# Altium footprint library Connectors.PcbLib: 245 footprints (part 5 of 18)
Each footprint in its own frame and in the unit in brackets; x right, y up, seen from the top. Pads: shape width x height; smd on the part's side, far side on the other; paste and mask are expansions set on the pad; w line width, h text height; cw(c..) or ccw(c..) is an arc to the next point about the centre after c.
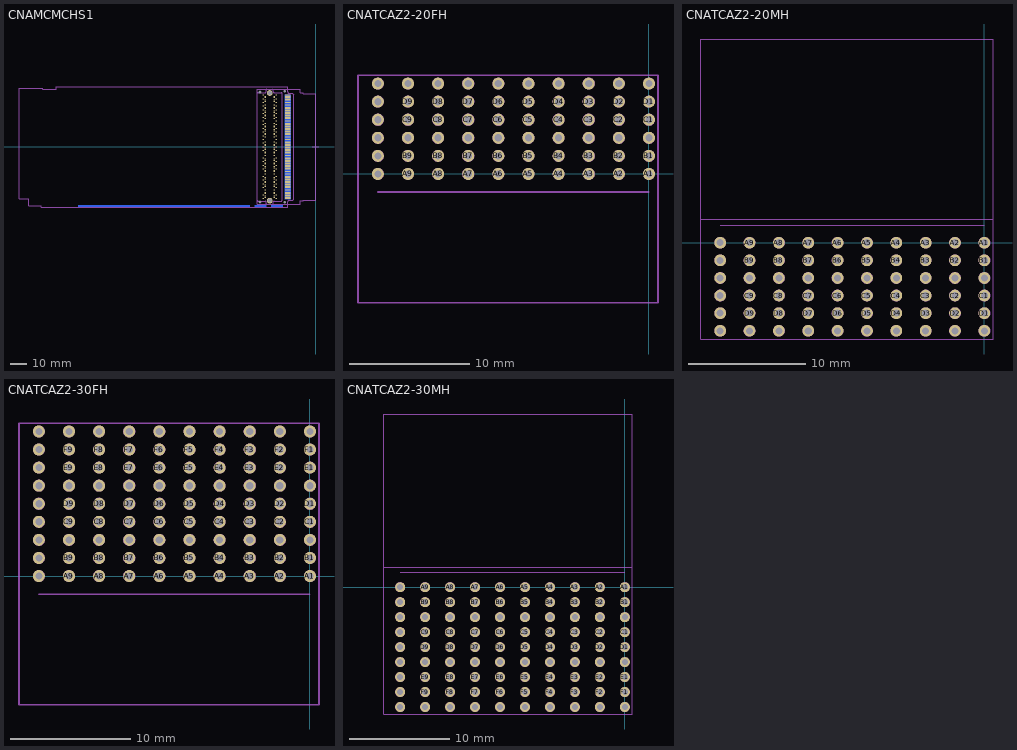
[diagram p4: the footprints below, top view; thin cyan lines are the x and y axes]

## CNAMCMCHS1 [mm] "AMC single for MCH connector standard"
pads (349):
  rrect50% 0.9x0.53 smd paste-2: A1(-31.95,31.5) A2(-30.75,30.75) A3(-30.75,30) A4(-31.95,29.25) A5(-30.75,28.5) A6(-30.75,27.75) A7(-31.95,27) A8(-30.75,26.25) A9(-30.75,25.5) A10(-31.95,24.75) A11(-30.75,24) A12(-30.75,23.25) A13(-31.95,22.5) A14(-30.75,21.75) A15(-30.75,21) A16(-31.95,20.25) A17(-30.75,19.5) A18(-30.75,18.75) A19(-31.95,18) A20(-30.75,17.25) A21(-30.75,16.5) A22(-31.95,15.75) A23(-30.75,15) A24(-30.75,14.25) A25(-31.95,13.5) A26(-30.75,12.75) A27(-30.75,12) A28(-31.95,11.25) A29(-30.75,10.5) A30(-30.75,9.75) A31(-31.95,9) A32(-30.75,8.25) A33(-30.75,7.5) A34(-31.95,6.75) A35(-30.75,6) A36(-30.75,5.25) A37(-31.95,4.5) A38(-30.75,3.75) A39(-30.75,3) A40(-31.95,2.25) A41(-30.75,1.5) A42(-30.75,0.75) A43(-31.95,0) A44(-30.75,-0.75) A45(-30.75,-1.5) A46(-31.95,-2.25) A47(-30.75,-3) A48(-30.75,-3.75) A49(-31.95,-4.5) A50(-30.75,-5.25) A51(-30.75,-6) A52(-31.95,-6.75) A53(-30.75,-7.5) A54(-30.75,-8.25) A55(-31.95,-9) A56(-30.75,-9.75) A57(-30.75,-10.5) A58(-31.95,-11.25) A59(-30.75,-12) A60(-30.75,-12.75) A61(-31.95,-13.5) A62(-30.75,-14.25) A63(-30.75,-15) A64(-31.95,-15.75) A65(-30.75,-16.5) A66(-30.75,-17.25) A67(-31.95,-18) A68(-30.75,-18.75) A69(-30.75,-19.5) A70(-31.95,-20.25) A71(-30.75,-21) A72(-30.75,-21.75) A73(-31.95,-22.5) A74(-30.75,-23.25) A75(-30.75,-24) A76(-31.95,-24.75) A77(-30.75,-25.5) A78(-30.75,-26.25) A79(-31.95,-27) A80(-30.75,-27.75) A81(-30.75,-28.5) A82(-31.95,-29.25) A83(-30.75,-30) A84(-30.75,-30.75) A85(-31.95,-31.5) A86(-24.05,-31.5) A87(-25.25,-30.75) A88(-25.25,-30) A89(-24.05,-29.25) A90(-25.25,-28.5) A91(-25.25,-27.75) A92(-24.05,-27) A93(-25.25,-26.25) A94(-25.25,-25.5) A95(-24.05,-24.75) A96(-25.25,-24) A97(-25.25,-23.25) A98(-24.05,-22.5) A99(-25.25,-21.75) A100(-25.25,-21) A101(-24.05,-20.25) A102(-25.25,-19.5) A103(-25.25,-18.75) A104(-24.05,-18) A105(-25.25,-17.25) A106(-25.25,-16.5) A107(-24.05,-15.75) A108(-25.25,-15) A109(-25.25,-14.25) A110(-24.05,-13.5) A111(-25.25,-12.75) A112(-25.25,-12) A113(-24.05,-11.25) A114(-25.25,-10.5) A115(-25.25,-9.75) A116(-24.05,-9) A117(-25.25,-8.25) A118(-25.25,-7.5) A119(-24.05,-6.75) A120(-25.25,-6) A121(-25.25,-5.25) A122(-24.05,-4.5) A123(-25.25,-3.75) A124(-25.25,-3) A125(-24.05,-2.25) A126(-25.25,-1.5) A127(-25.25,-0.75) A128(-24.05,0) A129(-25.25,0.75) A130(-25.25,1.5) A131(-24.05,2.25) A132(-25.25,3) A133(-25.25,3.75) A134(-24.05,4.5) A135(-25.25,5.25) A136(-25.25,6) A137(-24.05,6.75) A138(-25.25,7.5) A139(-25.25,8.25) A140(-24.05,9) A141(-25.25,9.75) A142(-25.25,10.5) A143(-24.05,11.25) A144(-25.25,12) A145(-25.25,12.75) A146(-24.05,13.5) A147(-25.25,14.25) A148(-25.25,15) A149(-24.05,15.75) A150(-25.25,16.5) A151(-25.25,17.25) A152(-24.05,18) A153(-25.25,18.75) A154(-25.25,19.5) A155(-24.05,20.25) A156(-25.25,21) A157(-25.25,21.75) A158(-24.05,22.5) A159(-25.25,23.25) A160(-25.25,24) A161(-24.05,24.75) A162(-25.25,25.5) A163(-25.25,26.25) A164(-24.05,27) A165(-25.25,27.75) A166(-25.25,28.5) A167(-24.05,29.25) A168(-25.25,30) A169(-25.25,30.75) A170(-24.05,31.5)
  rect 3.5x0.5 smd paste-2: B1(-17.05,31.5) B2(-17.05,30.75) B3(-17.05,30) B4(-17.05,29.25) B5(-17.05,28.5) B6(-17.05,27.75) B7(-17.05,27) B8(-17.05,26.25) B9(-17.05,25.5) B10(-17.05,24.75) B11(-17.05,24) B12(-17.05,23.25) B13(-17.05,22.5) B14(-17.05,21.75) B15(-17.05,21) B16(-17.05,20.25) B17(-17.05,19.5) B18(-17.05,18.75) B19(-17.05,18) B20(-17.05,17.25) B21(-17.05,16.5) B22(-17.05,15.75) B23(-17.05,15) B24(-17.05,14.25) B25(-17.05,13.5) B26(-17.05,12.75) B27(-17.05,12) B28(-17.05,11.25) B29(-17.05,10.5) B30(-17.05,9.75) B31(-17.05,9) B32(-17.05,8.25) B33(-17.05,7.5) B34(-17.05,6.75) B35(-17.05,6) B36(-17.05,5.25) B37(-17.05,4.5) B38(-17.05,3.75) B39(-17.05,3) B40(-17.05,2.25) B41(-17.05,1.5) B42(-17.05,0.75) B43(-17.05,0) B44(-17.05,-0.75) B45(-17.05,-1.5) B46(-17.05,-2.25) B47(-17.05,-3) B48(-17.05,-3.75) B49(-17.05,-4.5) B50(-17.05,-5.25) B51(-17.05,-6) B52(-17.05,-6.75) B53(-17.05,-7.5) B54(-17.05,-8.25) B55(-17.05,-9) B56(-17.05,-9.75) B57(-17.05,-10.5) B58(-17.05,-11.25) B59(-17.05,-12) B60(-17.05,-12.75) B61(-17.05,-13.5) B62(-17.05,-14.25) B63(-17.05,-15) B64(-17.05,-15.75) B65(-17.05,-16.5) B66(-17.05,-17.25) B67(-17.05,-18) B68(-17.05,-18.75) B69(-17.05,-19.5) B70(-17.05,-20.25) B71(-17.05,-21) B72(-17.05,-21.75) B73(-17.05,-22.5) B74(-17.05,-23.25) B75(-17.05,-24) B76(-17.05,-24.75) B77(-17.05,-25.5) B78(-17.05,-26.25) B79(-17.05,-27) B80(-17.05,-27.75) B81(-17.05,-28.5) B82(-17.05,-29.25) B83(-17.05,-30) B84(-17.05,-30.75) B85(-17.05,-31.5)
  rect 3.5x0.5 smd far side paste-2: B86(-17.05,-31.5) B87(-17.05,-30.75) B88(-17.05,-30) B89(-17.05,-29.25) B90(-17.05,-28.5) B91(-17.05,-27.75) B92(-17.05,-27) B93(-17.05,-26.25) B94(-17.05,-25.5) B95(-17.05,-24.75) B96(-17.05,-24) B97(-17.05,-23.25) B98(-17.05,-22.5) B99(-17.05,-21.75) B100(-17.05,-21) B101(-17.05,-20.25) B102(-17.05,-19.5) B103(-17.05,-18.75) B104(-17.05,-18) B105(-17.05,-17.25) B106(-17.05,-16.5) B107(-17.05,-15.75) B108(-17.05,-15) B109(-17.05,-14.25) B110(-17.05,-13.5) B111(-17.05,-12.75) B112(-17.05,-12) B113(-17.05,-11.25) B114(-17.05,-10.5) B115(-17.05,-9.75) B116(-17.05,-9) B117(-17.05,-8.25) B118(-17.05,-7.5) B119(-17.05,-6.75) B120(-17.05,-6) B121(-17.05,-5.25) B122(-17.05,-4.5) B123(-17.05,-3.75) B124(-17.05,-3) B125(-17.05,-2.25) B126(-17.05,-1.5) B127(-17.05,-0.75) B128(-17.05,0) B129(-17.05,0.75) B130(-17.05,1.5) B131(-17.05,2.25) B132(-17.05,3) B133(-17.05,3.75) B134(-17.05,4.5) B135(-17.05,5.25) B136(-17.05,6) B137(-17.05,6.75) B138(-17.05,7.5) B139(-17.05,8.25) B140(-17.05,9) B141(-17.05,9.75) B142(-17.05,10.5) B143(-17.05,11.25) B144(-17.05,12) B145(-17.05,12.75) B146(-17.05,13.5) B147(-17.05,14.25) B148(-17.05,15) B149(-17.05,15.75) B150(-17.05,16.5) B151(-17.05,17.25) B152(-17.05,18) B153(-17.05,18.75) B154(-17.05,19.5) B155(-17.05,20.25) B156(-17.05,21) B157(-17.05,21.75) B158(-17.05,22.5) B159(-17.05,23.25) B160(-17.05,24) B161(-17.05,24.75) B162(-17.05,25.5) B163(-17.05,26.25) B164(-17.05,27) B165(-17.05,27.75) B166(-17.05,28.5) B167(-17.05,29.25) B168(-17.05,30) B169(-17.05,30.75) B170(-17.05,31.5)
  rect 7x1 smd far side paste-3 mask-3: EP1(-23.5,-35.95) EP2(-33.5,-35.95)
  rect 104.45x1 smd far side paste-3 mask-3: EP3(-92.225,-35.95)
  rect 0x0 hole 1.9 unplated: MH1(-34,-33.5) MH2(-34,33.5)
  round 3.5 hole 2.5: MH3(-28,-32.75) MH4(-28,32.75)
  rect 0x0 hole 1.6 unplated: MH5(-18.8,-33.75) MH6(-18.8,33.75)
Top Solder:
  rectangle: -158,35.1 -16.866,36.9
  rectangle: -157.475,-36.9 -16.866,-35.1
  rectangle: -18.821,-32.766 -13.081,32.766
Bottom Solder:
  rectangle: -157.475,-36.9 -16.866,-35.1
  rectangle: -18.821,-32.766 -13.081,32.741
  rectangle: -158,35.1 -16.866,36.9
Mechanical 13:
  lines w0.102: 0,-32.43 0,32.43 -7.508,32.43 -7.508,32.88 -9.502,32.88 -9.502,35 -35.7,35 -35.7,-35 -9.5,-35 -9.5,-32.88 -7.506,-32.88 -7.506,-32.43 0.002,-32.43
Mechanical 14:
  lines w0.102: -35.5,-32.5 ccw(c-35,-32.5) -35,-33 -30.75,-33 cw(c-30.75,-33.5) -30.25,-33.5 -30.25,-34.5 ccw(c-29.75,-34.5) -29.75,-35 -26.25,-35 ccw(c-26.25,-34.5) -25.75,-34.5 -25.75,-33.5 cw(c-25.25,-33.5) -25.25,-33 -21,-33 ccw(c-21,-32.5) -20.5,-32.5 -20.5,32.5 ccw(c-21,32.5) -21,33 -25.25,33 cw(c-25.25,33.5) -25.75,33.5 -25.75,34.5 ccw(c-26.25,34.5) -26.25,35 -29.75,35 ccw(c-29.75,34.5) -30.25,34.5 -30.25,33.5 cw(c-30.75,33.5) -30.75,33 -35,33 ccw(c-35,32.5) -35.5,32.5 -35.5,-32.5
Mechanical 15:
  lines w0.1: -17,-36.75 -167,-36.75 -167,-35.75 -174.6,-35.75 -174.6,-31.55 -180.6,-31.55 -180.6,35.65 -166.25,35.65 -166.25,35.15 -158,35.15 -158,36.75 -17,36.75
  lines w0.102: -17,-36.75 -17,-33.516 ; -17,-33.525 cw(c-15.975,-33.525) -15.975,-32.5 -14.391,-32.5 ccw(c-14.391,-32) -14.038,-32.354 ; -17,36.75 -17,33.525 ccw(c-15.975,33.525) -15.975,32.5 -14.391,32.5 cw(c-14.391,32) -14.038,32.354 ; -14.032,-32.36 -13.442,-31.77 ; -14.032,32.36 -13.442,31.77 ; -13.446,-31.766 ccw(c-13.8,-31.412) -13.3,-31.412 -13.3,31.412 ccw(c-13.8,31.412) -13.446,31.766
  lines w0.15: -2,0 2,0
3D body: height 9.01, standoff -3.01, extent -12.959,-33.964 -10.449,-31.453
3D body: height 9.01, standoff -3.01, extent -12.959,31.453 -10.449,33.964
3D body: height 0.76, standoff 0.75, extent -7.495,-31.75 -0.777,-31.267
3D body: height 0.76, standoff 0.75, extent -7.495,-31 -0.766,-30.517
3D body: height 0.76, standoff 0.75, extent -7.495,-30.25 -1.223,-29.767
3D body: height 0.76, standoff 0.75, extent -7.495,-28 -1.539,-27.517
3D body: height 0.76, standoff 0.75, extent -7.495,-28.75 -1.539,-28.267
3D body: height 0.76, standoff 0.75, extent -7.495,-29.5 -0.777,-29.017
3D body: height 0.76, standoff 0.75, extent -7.495,-25.75 -1.539,-25.267
3D body: height 0.76, standoff 0.75, extent -7.495,-26.5 -1.539,-26.017
3D body: height 0.76, standoff 0.75, extent -7.495,-27.25 -0.777,-26.767
3D body: height 0.76, standoff 0.75, extent -7.495,-23.5 -1.539,-23.017
3D body: height 0.76, standoff 0.75, extent -7.495,-24.25 -1.539,-23.767
3D body: height 0.76, standoff 0.75, extent -7.495,-25 -0.777,-24.517
3D body: height 0.76, standoff 0.75, extent -7.495,-21.25 -1.223,-20.767
3D body: height 0.76, standoff 0.75, extent -7.495,-22 -0.766,-21.517
3D body: height 0.76, standoff 0.75, extent -7.495,-22.75 -0.777,-22.267
3D body: height 0.76, standoff 0.75, extent -7.495,-19 -1.539,-18.517
3D body: height 0.76, standoff 0.75, extent -7.495,-19.75 -1.539,-19.267
3D body: height 0.76, standoff 0.75, extent -7.495,-20.5 -0.777,-20.017
3D body: height 0.76, standoff 0.75, extent -7.495,-16.75 -1.539,-16.267
3D body: height 0.76, standoff 0.75, extent -7.495,-17.5 -1.539,-17.017
3D body: height 0.76, standoff 0.75, extent -7.495,-18.25 -0.777,-17.767
3D body: height 0.76, standoff 0.75, extent -7.495,-14.5 -1.539,-14.017
3D body: height 0.76, standoff 0.75, extent -7.495,-15.25 -1.539,-14.767
3D body: height 0.76, standoff 0.75, extent -7.495,-16 -0.777,-15.517
3D body: height 0.76, standoff 0.75, extent -7.495,-12.25 -1.539,-11.767
3D body: height 0.76, standoff 0.75, extent -7.495,-13 -1.539,-12.517
3D body: height 0.76, standoff 0.75, extent -7.495,-13.75 -0.777,-13.267
3D body: height 0.76, standoff 0.75, extent -7.495,-10 -1.223,-9.517
3D body: height 0.76, standoff 0.75, extent -7.495,-10.75 -0.766,-10.267
3D body: height 0.76, standoff 0.75, extent -7.495,-11.5 -0.777,-11.017
3D body: height 0.76, standoff 0.75, extent -7.495,-7.75 -1.539,-7.267
3D body: height 0.76, standoff 0.75, extent -7.495,-8.5 -1.539,-8.017
3D body: height 0.76, standoff 0.75, extent -7.495,-9.25 -0.777,-8.767
3D body: height 0.76, standoff 0.75, extent -7.495,-5.5 -1.539,-5.017
3D body: height 0.76, standoff 0.75, extent -7.495,-6.25 -1.539,-5.767
3D body: height 0.76, standoff 0.75, extent -7.495,-7 -0.777,-6.517
3D body: height 0.76, standoff 0.75, extent -7.495,-3.25 -1.539,-2.767
3D body: height 0.76, standoff 0.75, extent -7.495,-4 -1.539,-3.517
3D body: height 0.76, standoff 0.75, extent -7.495,-4.75 -0.777,-4.267
3D body: height 0.76, standoff 0.75, extent -7.495,-1 -1.539,-0.517
3D body: height 0.76, standoff 0.75, extent -7.495,-1.75 -1.539,-1.267
3D body: height 0.76, standoff 0.75, extent -7.495,-2.5 -0.777,-2.017
3D body: height 0.76, standoff 0.75, extent -7.495,1.25 -1.223,1.733
3D body: height 0.76, standoff 0.75, extent -7.495,0.5 -0.766,0.983
3D body: height 0.76, standoff 0.75, extent -7.495,-0.25 -0.777,0.233
3D body: height 0.76, standoff 0.75, extent -7.495,3.5 -1.539,3.983
3D body: height 0.76, standoff 0.75, extent -7.495,2.75 -1.539,3.233
3D body: height 0.76, standoff 0.75, extent -7.495,2 -0.777,2.483
3D body: height 0.76, standoff 0.75, extent -7.495,5.75 -1.539,6.233
3D body: height 0.76, standoff 0.75, extent -7.495,5 -1.539,5.483
3D body: height 0.76, standoff 0.75, extent -7.495,4.25 -0.777,4.733
3D body: height 0.76, standoff 0.75, extent -7.495,8 -1.539,8.483
3D body: height 0.76, standoff 0.75, extent -7.495,7.25 -1.539,7.733
3D body: height 0.76, standoff 0.75, extent -7.495,6.5 -0.777,6.983
3D body: height 0.76, standoff 0.75, extent -7.495,10.25 -1.539,10.733
3D body: height 0.76, standoff 0.75, extent -7.495,9.5 -1.539,9.983
3D body: height 0.76, standoff 0.75, extent -7.495,8.75 -0.777,9.233
3D body: height 0.76, standoff 0.75, extent -7.495,12.5 -1.223,12.983
3D body: height 0.76, standoff 0.75, extent -7.495,11.75 -0.766,12.233
3D body: height 0.76, standoff 0.75, extent -7.495,11 -0.777,11.483
3D body: height 0.76, standoff 0.75, extent -7.495,14.75 -1.539,15.233
3D body: height 0.76, standoff 0.75, extent -7.495,14 -1.539,14.483
3D body: height 0.76, standoff 0.75, extent -7.495,13.25 -0.777,13.733
3D body: height 0.76, standoff 0.75, extent -7.495,17 -1.539,17.483
3D body: height 0.76, standoff 0.75, extent -7.495,16.25 -1.539,16.733
3D body: height 0.76, standoff 0.75, extent -7.495,15.5 -0.777,15.983
3D body: height 0.76, standoff 0.75, extent -7.495,19.25 -1.223,19.733
3D body: height 0.76, standoff 0.75, extent -7.495,18.5 -0.766,18.983
3D body: height 0.76, standoff 0.75, extent -7.495,17.75 -0.777,18.233
3D body: height 0.76, standoff 0.75, extent -7.495,21.5 -1.539,21.983
3D body: height 0.76, standoff 0.75, extent -7.495,20.75 -1.539,21.233
3D body: height 0.76, standoff 0.75, extent -7.495,20 -0.777,20.483
3D body: height 0.76, standoff 0.75, extent -7.495,23.75 -1.539,24.233
3D body: height 0.76, standoff 0.75, extent -7.495,23 -1.539,23.483
3D body: height 0.76, standoff 0.75, extent -7.495,22.25 -0.777,22.733
3D body: height 0.76, standoff 0.75, extent -7.495,26 -1.223,26.483
3D body: height 0.76, standoff 0.75, extent -7.495,25.25 -0.766,25.733
3D body: height 0.76, standoff 0.75, extent -7.495,24.5 -0.777,24.983
3D body: height 0.76, standoff 0.75, extent -7.495,29.767 -2.112,30.25
3D body: height 0.76, standoff 0.75, extent -7.495,30.517 -0.766,31
3D body: height 0.76, standoff 0.75, extent -7.495,31.267 -0.777,31.75
3D body: height 0.76, standoff 0.75, extent -7.495,28.25 -1.223,28.733
3D body: height 0.76, standoff 0.75, extent -7.495,27.5 -1.223,27.983
3D body: height 0.76, standoff 0.75, extent -7.495,26.75 -0.777,27.233
3D body: height 0.76, standoff 0.75, extent -7.495,29 -0.766,29.483
3D body: height -0.75, standoff -0.76, extent -7.495,-31.75 -0.777,-31.267
3D body: height -0.75, standoff -0.76, extent -7.495,-31 -1.539,-30.517
3D body: height -0.75, standoff -0.76, extent -7.495,-30.25 -1.539,-29.767
3D body: height -0.75, standoff -0.76, extent -7.495,-28 -1.539,-27.517
3D body: height -0.75, standoff -0.76, extent -7.495,-28.75 -1.539,-28.267
3D body: height -0.75, standoff -0.76, extent -7.495,-29.5 -0.777,-29.017
3D body: height -0.75, standoff -0.76, extent -7.495,-25.75 -1.539,-25.267
3D body: height -0.75, standoff -0.76, extent -7.495,-26.5 -1.539,-26.017
3D body: height -0.75, standoff -0.76, extent -7.495,-27.25 -0.777,-26.767
3D body: height -0.75, standoff -0.76, extent -7.495,-23.5 -1.539,-23.017
3D body: height -0.75, standoff -0.76, extent -7.495,-24.25 -1.539,-23.767
3D body: height -0.75, standoff -0.76, extent -7.495,-25 -0.777,-24.517
3D body: height -0.75, standoff -0.76, extent -7.495,-21.25 -1.539,-20.767
3D body: height -0.75, standoff -0.76, extent -7.495,-22 -1.539,-21.517
3D body: height -0.75, standoff -0.76, extent -7.495,-22.75 -0.777,-22.267
3D body: height -0.75, standoff -0.76, extent -7.495,-19 -1.539,-18.517
3D body: height -0.75, standoff -0.76, extent -7.495,-19.75 -1.539,-19.267
3D body: height -0.75, standoff -0.76, extent -7.495,-20.5 -0.777,-20.017
3D body: height -0.75, standoff -0.76, extent -7.495,-16.75 -1.539,-16.267
3D body: height -0.75, standoff -0.76, extent -7.495,-17.5 -1.539,-17.017
3D body: height -0.75, standoff -0.76, extent -7.495,-18.25 -0.777,-17.767
3D body: height -0.75, standoff -0.76, extent -7.495,-14.5 -1.539,-14.017
3D body: height -0.75, standoff -0.76, extent -7.495,-15.25 -1.539,-14.767
3D body: height -0.75, standoff -0.76, extent -7.495,-16 -0.777,-15.517
3D body: height -0.75, standoff -0.76, extent -7.495,-12.25 -1.539,-11.767
3D body: height -0.75, standoff -0.76, extent -7.495,-13 -1.539,-12.517
3D body: height -0.75, standoff -0.76, extent -7.495,-13.75 -0.777,-13.267
3D body: height -0.75, standoff -0.76, extent -7.495,-10 -1.539,-9.517
3D body: height -0.75, standoff -0.76, extent -7.495,-10.75 -1.539,-10.267
3D body: height -0.75, standoff -0.76, extent -7.495,-11.5 -0.777,-11.017
3D body: height -0.75, standoff -0.76, extent -7.495,-7.75 -1.539,-7.267
3D body: height -0.75, standoff -0.76, extent -7.495,-8.5 -1.539,-8.017
3D body: height -0.75, standoff -0.76, extent -7.495,-9.25 -0.777,-8.767
3D body: height -0.75, standoff -0.76, extent -7.495,-5.5 -1.539,-5.017
3D body: height -0.75, standoff -0.76, extent -7.495,-6.25 -1.539,-5.767
3D body: height -0.75, standoff -0.76, extent -7.495,-7 -0.777,-6.517
3D body: height -0.75, standoff -0.76, extent -7.495,-3.25 -1.539,-2.767
3D body: height -0.75, standoff -0.76, extent -7.495,-4 -1.539,-3.517
3D body: height -0.75, standoff -0.76, extent -7.495,-4.75 -0.777,-4.267
3D body: height -0.75, standoff -0.76, extent -7.495,-1 -1.539,-0.517
3D body: height -0.75, standoff -0.76, extent -7.495,-1.75 -1.539,-1.267
3D body: height -0.75, standoff -0.76, extent -7.495,-2.5 -0.777,-2.017
3D body: height -0.75, standoff -0.76, extent -7.495,1.25 -1.539,1.733
3D body: height -0.75, standoff -0.76, extent -7.495,0.5 -1.539,0.983
3D body: height -0.75, standoff -0.76, extent -7.495,-0.25 -0.777,0.233
3D body: height -0.75, standoff -0.76, extent -7.495,3.5 -1.539,3.983
3D body: height -0.75, standoff -0.76, extent -7.495,2.75 -1.539,3.233
3D body: height -0.75, standoff -0.76, extent -7.495,2 -0.777,2.483
3D body: height -0.75, standoff -0.76, extent -7.495,5.75 -1.539,6.233
3D body: height -0.75, standoff -0.76, extent -7.495,5 -1.539,5.483
3D body: height -0.75, standoff -0.76, extent -7.495,4.25 -0.777,4.733
3D body: height -0.75, standoff -0.76, extent -7.495,8 -1.539,8.483
3D body: height -0.75, standoff -0.76, extent -7.495,7.25 -1.539,7.733
3D body: height -0.75, standoff -0.76, extent -7.495,6.5 -0.777,6.983
3D body: height -0.75, standoff -0.76, extent -7.495,10.25 -1.539,10.733
3D body: height -0.75, standoff -0.76, extent -7.495,9.5 -1.539,9.983
3D body: height -0.75, standoff -0.76, extent -7.495,8.75 -0.777,9.233
3D body: height -0.75, standoff -0.76, extent -7.495,12.5 -1.539,12.983
3D body: height -0.75, standoff -0.76, extent -7.495,11.75 -1.539,12.233
3D body: height -0.75, standoff -0.76, extent -7.495,11 -0.777,11.483
3D body: height -0.75, standoff -0.76, extent -7.495,14.75 -1.539,15.233
3D body: height -0.75, standoff -0.76, extent -7.495,14 -1.539,14.483
3D body: height -0.75, standoff -0.76, extent -7.495,13.25 -0.777,13.733
3D body: height -0.75, standoff -0.76, extent -7.495,17 -1.539,17.483
3D body: height -0.75, standoff -0.76, extent -7.495,16.25 -1.539,16.733
3D body: height -0.75, standoff -0.76, extent -7.495,15.5 -0.777,15.983
3D body: height -0.75, standoff -0.76, extent -7.495,19.25 -1.539,19.733
3D body: height -0.75, standoff -0.76, extent -7.495,18.5 -1.539,18.983
3D body: height -0.75, standoff -0.76, extent -7.495,17.75 -0.777,18.233
3D body: height -0.75, standoff -0.76, extent -7.495,21.5 -1.539,21.983
3D body: height -0.75, standoff -0.76, extent -7.495,20.75 -1.539,21.233
3D body: height -0.75, standoff -0.76, extent -7.495,20 -0.777,20.483
3D body: height -0.75, standoff -0.76, extent -7.495,23.75 -1.539,24.233
3D body: height -0.75, standoff -0.76, extent -7.495,23 -1.539,23.483
3D body: height -0.75, standoff -0.76, extent -7.495,22.25 -0.777,22.733
3D body: height -0.75, standoff -0.76, extent -7.495,26 -1.539,26.483
3D body: height -0.75, standoff -0.76, extent -7.495,25.25 -1.539,25.733
3D body: height -0.75, standoff -0.76, extent -7.495,24.5 -0.777,24.983
3D body: height -0.75, standoff -0.76, extent -7.495,29.767 -1.539,30.25
3D body: height -0.75, standoff -0.76, extent -7.495,30.517 -1.539,31
3D body: height -0.75, standoff -0.76, extent -7.495,31.267 -0.777,31.75
3D body: height -0.75, standoff -0.76, extent -7.495,28.25 -1.539,28.733
3D body: height -0.75, standoff -0.76, extent -7.495,27.5 -1.539,27.983
3D body: height -0.75, standoff -0.76, extent -7.495,26.75 -0.777,27.233
3D body: height -0.75, standoff -0.76, extent -7.495,29 -1.539,29.483
3D body: height 7.78, standoff 7.77, extent -7.495,-31.75 -0.777,-31.267
3D body: height 7.78, standoff 7.77, extent -7.495,-31 -1.539,-30.517
3D body: height 7.78, standoff 7.77, extent -7.495,-30.25 -1.539,-29.767
3D body: height 7.78, standoff 7.77, extent -7.495,-28 -1.539,-27.517
3D body: height 7.78, standoff 7.77, extent -7.495,-28.75 -1.539,-28.267
3D body: height 7.78, standoff 7.77, extent -7.495,-29.5 -0.777,-29.017
3D body: height 7.78, standoff 7.77, extent -7.495,-25.75 -1.539,-25.267
3D body: height 7.78, standoff 7.77, extent -7.495,-26.5 -1.539,-26.017
3D body: height 7.78, standoff 7.77, extent -7.495,-27.25 -0.777,-26.767
3D body: height 7.78, standoff 7.77, extent -7.495,-23.5 -1.539,-23.017
3D body: height 7.78, standoff 7.77, extent -7.495,-24.25 -1.539,-23.767
3D body: height 7.78, standoff 7.77, extent -7.495,-25 -0.777,-24.517
3D body: height 7.78, standoff 7.77, extent -7.495,-21.25 -1.539,-20.767
3D body: height 7.78, standoff 7.77, extent -7.495,-22 -1.539,-21.517
3D body: height 7.78, standoff 7.77, extent -7.495,-22.75 -0.777,-22.267
3D body: height 7.78, standoff 7.77, extent -7.495,-19 -1.539,-18.517
3D body: height 7.78, standoff 7.77, extent -7.495,-19.75 -1.539,-19.267
3D body: height 7.78, standoff 7.77, extent -7.495,-20.5 -0.777,-20.017
3D body: height 7.78, standoff 7.77, extent -7.495,-16.75 -1.539,-16.267
3D body: height 7.78, standoff 7.77, extent -7.495,-17.5 -1.539,-17.017
3D body: height 7.78, standoff 7.77, extent -7.495,-18.25 -0.777,-17.767
3D body: height 7.78, standoff 7.77, extent -7.495,-14.5 -1.539,-14.017
3D body: height 7.78, standoff 7.77, extent -7.495,-15.25 -1.539,-14.767
3D body: height 7.78, standoff 7.77, extent -7.495,-16 -0.777,-15.517
3D body: height 7.78, standoff 7.77, extent -7.495,-12.25 -1.539,-11.767
3D body: height 7.78, standoff 7.77, extent -7.495,-13 -1.539,-12.517
3D body: height 7.78, standoff 7.77, extent -7.495,-13.75 -0.777,-13.267
3D body: height 7.78, standoff 7.77, extent -7.495,-10 -1.539,-9.517
3D body: height 7.78, standoff 7.77, extent -7.495,-10.75 -1.539,-10.267
3D body: height 7.78, standoff 7.77, extent -7.495,-11.5 -0.777,-11.017
3D body: height 7.78, standoff 7.77, extent -7.495,-7.75 -1.539,-7.267
3D body: height 7.78, standoff 7.77, extent -7.495,-8.5 -1.539,-8.017
3D body: height 7.78, standoff 7.77, extent -7.495,-9.25 -0.777,-8.767
3D body: height 7.78, standoff 7.77, extent -7.495,-5.5 -1.539,-5.017
3D body: height 7.78, standoff 7.77, extent -7.495,-6.25 -1.539,-5.767
3D body: height 7.78, standoff 7.77, extent -7.495,-7 -0.777,-6.517
3D body: height 7.78, standoff 7.77, extent -7.495,-3.25 -1.539,-2.767
3D body: height 7.78, standoff 7.77, extent -7.495,-4 -1.539,-3.517
3D body: height 7.78, standoff 7.77, extent -7.495,-4.75 -0.777,-4.267
3D body: height 7.78, standoff 7.77, extent -7.495,-1 -1.539,-0.517
3D body: height 7.78, standoff 7.77, extent -7.495,-1.75 -1.539,-1.267
3D body: height 7.78, standoff 7.77, extent -7.495,-2.5 -0.777,-2.017
3D body: height 7.78, standoff 7.77, extent -7.495,1.25 -1.539,1.733
3D body: height 7.78, standoff 7.77, extent -7.495,0.5 -1.539,0.983
3D body: height 7.78, standoff 7.77, extent -7.495,-0.25 -0.777,0.233
3D body: height 7.78, standoff 7.77, extent -7.495,3.5 -1.539,3.983
3D body: height 7.78, standoff 7.77, extent -7.495,2.75 -1.539,3.233
3D body: height 7.78, standoff 7.77, extent -7.495,2 -0.777,2.483
3D body: height 7.78, standoff 7.77, extent -7.495,5.75 -1.539,6.233
3D body: height 7.78, standoff 7.77, extent -7.495,5 -1.539,5.483
3D body: height 7.78, standoff 7.77, extent -7.495,4.25 -0.777,4.733
3D body: height 7.78, standoff 7.77, extent -7.495,8 -1.539,8.483
3D body: height 7.78, standoff 7.77, extent -7.495,7.25 -1.539,7.733
3D body: height 7.78, standoff 7.77, extent -7.495,6.5 -0.777,6.983
3D body: height 7.78, standoff 7.77, extent -7.495,10.25 -1.539,10.733
3D body: height 7.78, standoff 7.77, extent -7.495,9.5 -1.539,9.983
3D body: height 7.78, standoff 7.77, extent -7.495,8.75 -0.777,9.233
3D body: height 7.78, standoff 7.77, extent -7.495,12.5 -1.539,12.983
3D body: height 7.78, standoff 7.77, extent -7.495,11.75 -1.539,12.233
3D body: height 7.78, standoff 7.77, extent -7.495,11 -0.777,11.483
3D body: height 7.78, standoff 7.77, extent -7.495,14.75 -1.539,15.233
3D body: height 7.78, standoff 7.77, extent -7.495,14 -1.539,14.483
3D body: height 7.78, standoff 7.77, extent -7.495,13.25 -0.777,13.733
3D body: height 7.78, standoff 7.77, extent -7.495,17 -1.539,17.483
3D body: height 7.78, standoff 7.77, extent -7.495,16.25 -1.539,16.733
3D body: height 7.78, standoff 7.77, extent -7.495,15.5 -0.777,15.983
3D body: height 7.78, standoff 7.77, extent -7.495,19.25 -1.539,19.733
3D body: height 7.78, standoff 7.77, extent -7.495,18.5 -1.539,18.983
3D body: height 7.78, standoff 7.77, extent -7.495,17.75 -0.777,18.233
3D body: height 7.78, standoff 7.77, extent -7.495,21.5 -1.539,21.983
3D body: height 7.78, standoff 7.77, extent -7.495,20.75 -1.539,21.233
3D body: height 7.78, standoff 7.77, extent -7.495,20 -0.777,20.483
3D body: height 7.78, standoff 7.77, extent -7.495,23.75 -1.539,24.233
3D body: height 7.78, standoff 7.77, extent -7.495,23 -1.539,23.483
3D body: height 7.78, standoff 7.77, extent -7.495,22.25 -0.777,22.733
3D body: height 7.78, standoff 7.77, extent -7.495,26 -1.539,26.483
3D body: height 7.78, standoff 7.77, extent -7.495,25.25 -1.539,25.733
3D body: height 7.78, standoff 7.77, extent -7.495,24.5 -0.777,24.983
3D body: height 7.78, standoff 7.77, extent -7.495,29.767 -1.539,30.25
3D body: height 7.78, standoff 7.77, extent -7.495,30.517 -1.539,31
3D body: height 7.78, standoff 7.77, extent -7.495,31.267 -0.777,31.75
3D body: height 7.78, standoff 7.77, extent -7.495,28.25 -1.539,28.733
3D body: height 7.78, standoff 7.77, extent -7.495,27.5 -1.539,27.983
3D body: height 7.78, standoff 7.77, extent -7.495,26.75 -0.777,27.233
3D body: height 7.78, standoff 7.77, extent -7.495,29 -1.539,29.483
3D body: height 6.27, standoff 6.26, extent -7.495,29 -1.539,29.483
3D body: height 6.27, standoff 6.26, extent -7.495,26.75 -0.777,27.233
3D body: height 6.27, standoff 6.26, extent -7.495,27.5 -1.539,27.983
3D body: height 6.27, standoff 6.26, extent -7.495,28.25 -1.539,28.733
3D body: height 6.27, standoff 6.26, extent -7.495,31.267 -0.777,31.75
3D body: height 6.27, standoff 6.26, extent -7.495,30.517 -1.539,31
3D body: height 6.27, standoff 6.26, extent -7.495,29.767 -1.539,30.25
3D body: height 6.27, standoff 6.26, extent -7.495,24.5 -0.777,24.983
3D body: height 6.27, standoff 6.26, extent -7.495,25.25 -1.539,25.733
3D body: height 6.27, standoff 6.26, extent -7.495,26 -1.539,26.483
3D body: height 6.27, standoff 6.26, extent -7.495,22.25 -0.777,22.733
3D body: height 6.27, standoff 6.26, extent -7.495,23 -1.539,23.483
3D body: height 6.27, standoff 6.26, extent -7.495,23.75 -1.539,24.233
3D body: height 6.27, standoff 6.26, extent -7.495,20 -0.777,20.483
3D body: height 6.27, standoff 6.26, extent -7.495,20.75 -1.539,21.233
3D body: height 6.27, standoff 6.26, extent -7.495,21.5 -1.539,21.983
3D body: height 6.27, standoff 6.26, extent -7.495,17.75 -0.777,18.233
3D body: height 6.27, standoff 6.26, extent -7.495,18.5 -1.539,18.983
3D body: height 6.27, standoff 6.26, extent -7.495,19.25 -1.539,19.733
3D body: height 6.27, standoff 6.26, extent -7.495,15.5 -0.777,15.983
3D body: height 6.27, standoff 6.26, extent -7.495,16.25 -1.539,16.733
3D body: height 6.27, standoff 6.26, extent -7.495,17 -1.539,17.483
3D body: height 6.27, standoff 6.26, extent -7.495,13.25 -0.777,13.733
3D body: height 6.27, standoff 6.26, extent -7.495,14 -1.539,14.483
3D body: height 6.27, standoff 6.26, extent -7.495,14.75 -1.539,15.233
3D body: height 6.27, standoff 6.26, extent -7.495,11 -0.777,11.483
3D body: height 6.27, standoff 6.26, extent -7.495,11.75 -1.539,12.233
3D body: height 6.27, standoff 6.26, extent -7.495,12.5 -1.539,12.983
3D body: height 6.27, standoff 6.26, extent -7.495,8.75 -0.777,9.233
3D body: height 6.27, standoff 6.26, extent -7.495,9.5 -1.539,9.983
3D body: height 6.27, standoff 6.26, extent -7.495,10.25 -1.539,10.733
3D body: height 6.27, standoff 6.26, extent -7.495,6.5 -0.777,6.983
3D body: height 6.27, standoff 6.26, extent -7.495,7.25 -1.539,7.733
3D body: height 6.27, standoff 6.26, extent -7.495,8 -1.539,8.483
3D body: height 6.27, standoff 6.26, extent -7.495,4.25 -0.777,4.733
3D body: height 6.27, standoff 6.26, extent -7.495,5 -1.539,5.483
3D body: height 6.27, standoff 6.26, extent -7.495,5.75 -1.539,6.233
3D body: height 6.27, standoff 6.26, extent -7.495,2 -0.777,2.483
3D body: height 6.27, standoff 6.26, extent -7.495,2.75 -1.539,3.233
3D body: height 6.27, standoff 6.26, extent -7.495,3.5 -1.539,3.983
3D body: height 6.27, standoff 6.26, extent -7.495,-0.25 -0.777,0.233
3D body: height 6.27, standoff 6.26, extent -7.495,0.5 -1.539,0.983
3D body: height 6.27, standoff 6.26, extent -7.495,1.25 -1.539,1.733
3D body: height 6.27, standoff 6.26, extent -7.495,-2.5 -0.777,-2.017
3D body: height 6.27, standoff 6.26, extent -7.495,-1.75 -1.539,-1.267
3D body: height 6.27, standoff 6.26, extent -7.495,-1 -1.539,-0.517
3D body: height 6.27, standoff 6.26, extent -7.495,-4.75 -0.777,-4.267
3D body: height 6.27, standoff 6.26, extent -7.495,-4 -1.539,-3.517
3D body: height 6.27, standoff 6.26, extent -7.495,-3.25 -1.539,-2.767
3D body: height 6.27, standoff 6.26, extent -7.495,-7 -0.777,-6.517
3D body: height 6.27, standoff 6.26, extent -7.495,-6.25 -1.539,-5.767
3D body: height 6.27, standoff 6.26, extent -7.495,-5.5 -1.539,-5.017
3D body: height 6.27, standoff 6.26, extent -7.495,-9.25 -0.777,-8.767
3D body: height 6.27, standoff 6.26, extent -7.495,-8.5 -1.539,-8.017
3D body: height 6.27, standoff 6.26, extent -7.495,-7.75 -1.539,-7.267
3D body: height 6.27, standoff 6.26, extent -7.495,-11.5 -0.777,-11.017
3D body: height 6.27, standoff 6.26, extent -7.495,-10.75 -1.539,-10.267
3D body: height 6.27, standoff 6.26, extent -7.495,-10 -1.539,-9.517
3D body: height 6.27, standoff 6.26, extent -7.495,-13.75 -0.777,-13.267
3D body: height 6.27, standoff 6.26, extent -7.495,-13 -1.539,-12.517
3D body: height 6.27, standoff 6.26, extent -7.495,-12.25 -1.539,-11.767
3D body: height 6.27, standoff 6.26, extent -7.495,-16 -0.777,-15.517
3D body: height 6.27, standoff 6.26, extent -7.495,-15.25 -1.539,-14.767
3D body: height 6.27, standoff 6.26, extent -7.495,-14.5 -1.539,-14.017
3D body: height 6.27, standoff 6.26, extent -7.495,-18.25 -0.777,-17.767
3D body: height 6.27, standoff 6.26, extent -7.495,-17.5 -1.539,-17.017
3D body: height 6.27, standoff 6.26, extent -7.495,-16.75 -1.539,-16.267
3D body: height 6.27, standoff 6.26, extent -7.495,-20.5 -0.777,-20.017
3D body: height 6.27, standoff 6.26, extent -7.495,-19.75 -1.539,-19.267
3D body: height 6.27, standoff 6.26, extent -7.495,-19 -1.539,-18.517
3D body: height 6.27, standoff 6.26, extent -7.495,-22.75 -0.777,-22.267
3D body: height 6.27, standoff 6.26, extent -7.495,-22 -1.539,-21.517
3D body: height 6.27, standoff 6.26, extent -7.495,-21.25 -1.539,-20.767
3D body: height 6.27, standoff 6.26, extent -7.495,-25 -0.777,-24.517
3D body: height 6.27, standoff 6.26, extent -7.495,-24.25 -1.539,-23.767
3D body: height 6.27, standoff 6.26, extent -7.495,-23.5 -1.539,-23.017
3D body: height 6.27, standoff 6.26, extent -7.495,-27.25 -0.777,-26.767
3D body: height 6.27, standoff 6.26, extent -7.495,-26.5 -1.539,-26.017
3D body: height 6.27, standoff 6.26, extent -7.495,-25.75 -1.539,-25.267
3D body: height 6.27, standoff 6.26, extent -7.495,-29.5 -0.777,-29.017
3D body: height 6.27, standoff 6.26, extent -7.495,-28.75 -1.539,-28.267
3D body: height 6.27, standoff 6.26, extent -7.495,-28 -1.539,-27.517
3D body: height 6.27, standoff 6.26, extent -7.495,-30.25 -1.539,-29.767
3D body: height 6.27, standoff 6.26, extent -7.495,-31 -1.539,-30.517
3D body: height 6.27, standoff 6.26, extent -7.495,-31.75 -0.777,-31.267
3D body: height 3.7, standoff 0, extent -35.702,-35 -20.3,35
3D body: height 7.02, standoff 3.7, extent -35.702,-35 -20.3,35
3D body: height 9, standoff -3, extent -20.3,-35 -9.5,35
3D body: height 9, standoff -3, extent -9.502,-32.88 -7.508,32.88
3D body: height 0.75, standoff -0.75, extent -7.5,-32.43 0,32.43
3D body: height 7.77, standoff 6.27, extent -7.5,-32.43 0,32.43
3D body: height 0, standoff -1.5, extent -34.948,32.555 -33.052,34.451
3D body: height 0, standoff -1.5, extent -34.948,-34.445 -33.052,-32.549
3D body: height 9.01, standoff -3.01, extent -19.605,-34.551 -17.991,-32.937
3D body: height 9.01, standoff -3.01, extent -19.605,32.949 -17.991,34.563
3D body: height -1.6, standoff -4.7, extent -35.51,-35.01 -20.49,35.01

## CNATCAZ2-20FH [mm] "ATCA Zone 2 20 shielded pairs female horizontal daughterboard"
pads (60):
  round 1 hole 0.6: A1(0,0) A2(-2.5,0) A3(-5,0) A4(-7.5,0) A5(-10,0) A6(-12.5,0) A7(-15,0) A8(-17.5,0) A9(-20,0) A10(-22.5,0) B1(0,1.5) B2(-2.5,1.5) B3(-5,1.5) B4(-7.5,1.5) B5(-10,1.5) B6(-12.5,1.5) B7(-15,1.5) B8(-17.5,1.5) B9(-20,1.5) B10(-22.5,1.5) BG1(0,3) BG2(-2.5,3) BG3(-5,3) BG4(-7.5,3) BG5(-10,3) BG6(-12.5,3) BG7(-15,3) BG8(-17.5,3) BG9(-20,3) BG10(-22.5,3) C1(0,4.5) C2(-2.5,4.5) C3(-5,4.5) C4(-7.5,4.5) C5(-10,4.5) C6(-12.5,4.5) C7(-15,4.5) C8(-17.5,4.5) C9(-20,4.5) C10(-22.5,4.5) D1(0,6) D2(-2.5,6) D3(-5,6) D4(-7.5,6) D5(-10,6) D6(-12.5,6) D7(-15,6) D8(-17.5,6) D9(-20,6) D10(-22.5,6) DG1(0,7.5) DG2(-2.5,7.5) DG3(-5,7.5) DG4(-7.5,7.5) DG5(-10,7.5) DG6(-12.5,7.5) DG7(-15,7.5) DG8(-17.5,7.5) DG9(-20,7.5) DG10(-22.5,7.5)
Mechanical 13:
  lines w0.127: -24.15,-10.7 0.75,-10.7 0.75,8.2 -24.15,8.2 -24.15,-10.7
Mechanical 15:
  lines w0.127: -22.5,-1.5 0,-1.5
  text "DAUGHTER BOARD" at -16.7,-1.2 h0.8
Mechanical 16:
  circle w1: c-22.5,0 r0.001
  circle w1: c0,0 r0.001
  circle w1: c-10,0 r0.001
  circle w1: c-7.5,0 r0.001
  circle w1: c-5,0 r0.001
  circle w1: c-2.5,0 r0.001
  circle w1: c-12.5,0 r0.001
  circle w1: c-15,0 r0.001
  circle w1: c-17.5,0 r0.001
  circle w1: c-20,0 r0.001
  circle w1: c-22.5,1.5 r0.001
  circle w1: c0,1.5 r0.001
  circle w1: c-10,1.5 r0.001
  circle w1: c-7.5,1.5 r0.001
  circle w1: c-5,1.5 r0.001
  circle w1: c-2.5,1.5 r0.001
  circle w1: c-12.5,1.5 r0.001
  circle w1: c-15,1.5 r0.001
  circle w1: c-17.5,1.5 r0.001
  circle w1: c-20,1.5 r0.001
  circle w1: c-22.5,3 r0.001
  circle w1: c0,3 r0.001
  circle w1: c-10,3 r0.001
  circle w1: c-7.5,3 r0.001
  circle w1: c-5,3 r0.001
  circle w1: c-2.5,3 r0.001
  circle w1: c-12.5,3 r0.001
  circle w1: c-15,3 r0.001
  circle w1: c-17.5,3 r0.001
  circle w1: c-20,3 r0.001
  circle w1: c-22.5,4.5 r0.001
  circle w1: c0,4.5 r0.001
  circle w1: c-10,4.5 r0.001
  circle w1: c-7.5,4.5 r0.001
  circle w1: c-5,4.5 r0.001
  circle w1: c-2.5,4.5 r0.001
  circle w1: c-12.5,4.5 r0.001
  circle w1: c-15,4.5 r0.001
  circle w1: c-17.5,4.5 r0.001
  circle w1: c-20,4.5 r0.001
  circle w1: c-22.5,6 r0.001
  circle w1: c0,6 r0.001
  circle w1: c-10,6 r0.001
  circle w1: c-7.5,6 r0.001
  circle w1: c-5,6 r0.001
  circle w1: c-2.5,6 r0.001
  circle w1: c-12.5,6 r0.001
  circle w1: c-15,6 r0.001
  circle w1: c-17.5,6 r0.001
  circle w1: c-20,6 r0.001
  circle w1: c-22.5,7.5 r0.001
  circle w1: c0,7.5 r0.001
  circle w1: c-10,7.5 r0.001
  circle w1: c-7.5,7.5 r0.001
  circle w1: c-5,7.5 r0.001
  circle w1: c-2.5,7.5 r0.001
  circle w1: c-12.5,7.5 r0.001
  circle w1: c-15,7.5 r0.001
  circle w1: c-17.5,7.5 r0.001
  circle w1: c-20,7.5 r0.001
  text "Finished hole: 0.6 ± 0.05 mm" at 0.508,-1.905 h2.5
  text "Drilled hole: 0.7 ± 0.02 mm" at 0.508,-3.937 h2.5
3D body: height 12.19, standoff -4.66, extent -24.15,-11.7 0.75,12.7

## CNATCAZ2-20MH [mm] "ATCA Zone 2 20 shielded pairs male horizontal"
pads (60):
  round 1 hole 0.6: A1(0,0) A2(-2.5,0) A3(-5,0) A4(-7.5,0) A5(-10,0) A6(-12.5,0) A7(-15,0) A8(-17.5,0) A9(-20,0) A10(-22.5,0) B1(0,-1.5) B2(-2.5,-1.5) B3(-5,-1.5) B4(-7.5,-1.5) B5(-10,-1.5) B6(-12.5,-1.5) B7(-15,-1.5) B8(-17.5,-1.5) B9(-20,-1.5) B10(-22.5,-1.5) BG1(0,-3) BG2(-2.5,-3) BG3(-5,-3) BG4(-7.5,-3) BG5(-10,-3) BG6(-12.5,-3) BG7(-15,-3) BG8(-17.5,-3) BG9(-20,-3) BG10(-22.5,-3) C1(0,-4.5) C2(-2.5,-4.5) C3(-5,-4.5) C4(-7.5,-4.5) C5(-10,-4.5) C6(-12.5,-4.5) C7(-15,-4.5) C8(-17.5,-4.5) C9(-20,-4.5) C10(-22.5,-4.5) D1(0,-6) D2(-2.5,-6) D3(-5,-6) D4(-7.5,-6) D5(-10,-6) D6(-12.5,-6) D7(-15,-6) D8(-17.5,-6) D9(-20,-6) D10(-22.5,-6) DG1(0,-7.5) DG2(-2.5,-7.5) DG3(-5,-7.5) DG4(-7.5,-7.5) DG5(-10,-7.5) DG6(-12.5,-7.5) DG7(-15,-7.5) DG8(-17.5,-7.5) DG9(-20,-7.5) DG10(-22.5,-7.5)
Mechanical 13:
  lines w0.1: -24.15,2 0.75,2 ; 0.725,17.35 -24.15,17.35 -24.15,-8.2 0.75,-8.2 0.75,17.35
Mechanical 15:
  lines w0.1: -22.5,1.5 0,1.5
Mechanical 16:
  circle w1: c-22.5,-1.5 r0.001
  circle w1: c-20,0 r0.001
  circle w1: c-22.5,0 r0.001
  circle w1: c-17.5,0 r0.001
  circle w1: c-15,0 r0.001
  circle w1: c-12.5,0 r0.001
  circle w1: c-10,0 r0.001
  circle w1: c-7.5,0 r0.001
  circle w1: c-5,0 r0.001
  circle w1: c-2.5,0 r0.001
  circle w1: c0,0 r0.001
  circle w1: c0,-1.5 r0.001
  circle w1: c-2.5,-1.5 r0.001
  circle w1: c-5,-1.5 r0.001
  circle w1: c-7.5,-1.5 r0.001
  circle w1: c-10,-1.5 r0.001
  circle w1: c-12.5,-1.5 r0.001
  circle w1: c-15,-1.5 r0.001
  circle w1: c-17.5,-1.5 r0.001
  circle w1: c-20,-1.5 r0.001
  circle w1: c-20,-3 r0.001
  circle w1: c-17.5,-3 r0.001
  circle w1: c-15,-3 r0.001
  circle w1: c-12.5,-3 r0.001
  circle w1: c-10,-3 r0.001
  circle w1: c-7.5,-3 r0.001
  circle w1: c-5,-3 r0.001
  circle w1: c-2.5,-3 r0.001
  circle w1: c0,-3 r0.001
  circle w1: c-22.5,-3 r0.001
  circle w1: c-20,-4.5 r0.001
  circle w1: c-17.5,-4.5 r0.001
  circle w1: c-15,-4.5 r0.001
  circle w1: c-12.5,-4.5 r0.001
  circle w1: c-10,-4.5 r0.001
  circle w1: c-7.5,-4.5 r0.001
  circle w1: c-5,-4.5 r0.001
  circle w1: c-2.5,-4.5 r0.001
  circle w1: c0,-4.5 r0.001
  circle w1: c-22.5,-4.5 r0.001
  circle w1: c-20,-6 r0.001
  circle w1: c-17.5,-6 r0.001
  circle w1: c-15,-6 r0.001
  circle w1: c-12.5,-6 r0.001
  circle w1: c-10,-6 r0.001
  circle w1: c-7.5,-6 r0.001
  circle w1: c-5,-6 r0.001
  circle w1: c-2.5,-6 r0.001
  circle w1: c0,-6 r0.001
  circle w1: c-22.5,-6 r0.001
  circle w1: c-20,-7.5 r0.001
  circle w1: c-17.5,-7.5 r0.001
  circle w1: c-15,-7.5 r0.001
  circle w1: c-12.5,-7.5 r0.001
  circle w1: c-10,-7.5 r0.001
  circle w1: c-7.5,-7.5 r0.001
  circle w1: c-5,-7.5 r0.001
  circle w1: c-2.5,-7.5 r0.001
  circle w1: c0,-7.5 r0.001
  circle w1: c-22.5,-7.5 r0.001
  text "Finished hole: 0.6 ± 0.05 mm" at -24.003,2.286 h2.5
  text "Drilled hole: 0.7 ± 0.02 mm" at -24.003,4.318 h2.5
3D body: height 13.34, standoff -5.66, extent -24.15,-12.65 0.75,17.35

## CNATCAZ2-30FH [mm] "ATCA Zone 2 30 shielded pairs female horizontal daughterboard"
pads (90):
  round 1 hole 0.6: A1(0,0) A2(-2.5,0) A3(-5,0) A4(-7.5,0) A5(-10,0) A6(-12.5,0) A7(-15,0) A8(-17.5,0) A9(-20,0) A10(-22.5,0) B1(0,1.5) B2(-2.5,1.5) B3(-5,1.5) B4(-7.5,1.5) B5(-10,1.5) B6(-12.5,1.5) B7(-15,1.5) B8(-17.5,1.5) B9(-20,1.5) B10(-22.5,1.5) BG1(0,3) BG2(-2.5,3) BG3(-5,3) BG4(-7.5,3) BG5(-10,3) BG6(-12.5,3) BG7(-15,3) BG8(-17.5,3) BG9(-20,3) BG10(-22.5,3) C1(0,4.5) C2(-2.5,4.5) C3(-5,4.5) C4(-7.5,4.5) C5(-10,4.5) C6(-12.5,4.5) C7(-15,4.5) C8(-17.5,4.5) C9(-20,4.5) C10(-22.5,4.5) D1(0,6) D2(-2.5,6) D3(-5,6) D4(-7.5,6) D5(-10,6) D6(-12.5,6) D7(-15,6) D8(-17.5,6) D9(-20,6) D10(-22.5,6) DG1(0,7.5) DG2(-2.5,7.5) DG3(-5,7.5) DG4(-7.5,7.5) DG5(-10,7.5) DG6(-12.5,7.5) DG7(-15,7.5) DG8(-17.5,7.5) DG9(-20,7.5) DG10(-22.5,7.5) E1(0,9) E2(-2.5,9) E3(-5,9) E4(-7.5,9) E5(-10,9) E6(-12.5,9) E7(-15,9) E8(-17.5,9) E9(-20,9) E10(-22.5,9) F1(0,10.5) F2(-2.5,10.5) F3(-5,10.5) F4(-7.5,10.5) F5(-10,10.5) F6(-12.5,10.5) F7(-15,10.5) F8(-17.5,10.5) F9(-20,10.5) F10(-22.5,10.5) FG1(0,12) FG2(-2.5,12) FG3(-5,12) FG4(-7.5,12) FG5(-10,12) FG6(-12.5,12) FG7(-15,12) FG8(-17.5,12) FG9(-20,12) FG10(-22.5,12)
Mechanical 13:
  lines w0.127: -24.15,-10.7 0.75,-10.7 0.75,12.7 -24.15,12.7 -24.15,-10.7
Mechanical 15:
  lines w0.127: -22.5,-1.5 0,-1.5
  text "DAUGHTER BOARD" at -16.7,-1.2 h0.8
Mechanical 16:
  circle w1: c-20,12 r0.001
  circle w1: c-17.5,12 r0.001
  circle w1: c-15,12 r0.001
  circle w1: c-12.5,12 r0.001
  circle w1: c-2.5,12 r0.001
  circle w1: c-5,12 r0.001
  circle w1: c-7.5,12 r0.001
  circle w1: c-10,12 r0.001
  circle w1: c0,12 r0.001
  circle w1: c-22.5,12 r0.001
  circle w1: c-20,10.5 r0.001
  circle w1: c-17.5,10.5 r0.001
  circle w1: c-15,10.5 r0.001
  circle w1: c-12.5,10.5 r0.001
  circle w1: c-2.5,10.5 r0.001
  circle w1: c-5,10.5 r0.001
  circle w1: c-7.5,10.5 r0.001
  circle w1: c-10,10.5 r0.001
  circle w1: c0,10.5 r0.001
  circle w1: c-22.5,10.5 r0.001
  circle w1: c-20,9 r0.001
  circle w1: c-17.5,9 r0.001
  circle w1: c-15,9 r0.001
  circle w1: c-12.5,9 r0.001
  circle w1: c-2.5,9 r0.001
  circle w1: c-5,9 r0.001
  circle w1: c-7.5,9 r0.001
  circle w1: c-10,9 r0.001
  circle w1: c0,9 r0.001
  circle w1: c-22.5,9 r0.001
  circle w1: c-20,7.5 r0.001
  circle w1: c-17.5,7.5 r0.001
  circle w1: c-15,7.5 r0.001
  circle w1: c-12.5,7.5 r0.001
  circle w1: c-2.5,7.5 r0.001
  circle w1: c-5,7.5 r0.001
  circle w1: c-7.5,7.5 r0.001
  circle w1: c-10,7.5 r0.001
  circle w1: c0,7.5 r0.001
  circle w1: c-22.5,7.5 r0.001
  circle w1: c-20,6 r0.001
  circle w1: c-17.5,6 r0.001
  circle w1: c-15,6 r0.001
  circle w1: c-12.5,6 r0.001
  circle w1: c-2.5,6 r0.001
  circle w1: c-5,6 r0.001
  circle w1: c-7.5,6 r0.001
  circle w1: c-10,6 r0.001
  circle w1: c0,6 r0.001
  circle w1: c-22.5,6 r0.001
  circle w1: c-20,4.5 r0.001
  circle w1: c-17.5,4.5 r0.001
  circle w1: c-15,4.5 r0.001
  circle w1: c-12.5,4.5 r0.001
  circle w1: c-2.5,4.5 r0.001
  circle w1: c-5,4.5 r0.001
  circle w1: c-7.5,4.5 r0.001
  circle w1: c-10,4.5 r0.001
  circle w1: c0,4.5 r0.001
  circle w1: c-22.5,4.5 r0.001
  circle w1: c-20,3 r0.001
  circle w1: c-17.5,3 r0.001
  circle w1: c-15,3 r0.001
  circle w1: c-12.5,3 r0.001
  circle w1: c-2.5,3 r0.001
  circle w1: c-5,3 r0.001
  circle w1: c-7.5,3 r0.001
  circle w1: c-10,3 r0.001
  circle w1: c0,3 r0.001
  circle w1: c-22.5,3 r0.001
  circle w1: c-20,1.5 r0.001
  circle w1: c-17.5,1.5 r0.001
  circle w1: c-15,1.5 r0.001
  circle w1: c-12.5,1.5 r0.001
  circle w1: c-2.5,1.5 r0.001
  circle w1: c-5,1.5 r0.001
  circle w1: c-7.5,1.5 r0.001
  circle w1: c-10,1.5 r0.001
  circle w1: c0,1.5 r0.001
  circle w1: c-22.5,1.5 r0.001
  circle w1: c-20,0 r0.001
  circle w1: c-17.5,0 r0.001
  circle w1: c-15,0 r0.001
  circle w1: c-12.5,0 r0.001
  circle w1: c-2.5,0 r0.001
  circle w1: c-5,0 r0.001
  circle w1: c-7.5,0 r0.001
  circle w1: c-10,0 r0.001
  circle w1: c0,0 r0.001
  circle w1: c-22.5,0 r0.001
  text "Drilled hole: 0.7 ± 0.02 mm" at 0.508,-3.937 h2.5
  text "Finished hole: 0.6 ± 0.05 mm" at 0.508,-1.905 h2.5
3D body: height 12.19, standoff -4.66, extent -24.15,-11.7 0.75,12.7

## CNATCAZ2-30MH [mm] "ATCA Zone 2 30 shielded pairs male horizontal"
pads (90):
  round 1 hole 0.6: A1(0,0) A2(-2.5,0) A3(-5,0) A4(-7.5,0) A5(-10,0) A6(-12.5,0) A7(-15,0) A8(-17.5,0) A9(-20,0) A10(-22.5,0) B1(0,-1.5) B2(-2.5,-1.5) B3(-5,-1.5) B4(-7.5,-1.5) B5(-10,-1.5) B6(-12.5,-1.5) B7(-15,-1.5) B8(-17.5,-1.5) B9(-20,-1.5) B10(-22.5,-1.5) BG1(0,-3) BG2(-2.5,-3) BG3(-5,-3) BG4(-7.5,-3) BG5(-10,-3) BG6(-12.5,-3) BG7(-15,-3) BG8(-17.5,-3) BG9(-20,-3) BG10(-22.5,-3) C1(0,-4.5) C2(-2.5,-4.5) C3(-5,-4.5) C4(-7.5,-4.5) C5(-10,-4.5) C6(-12.5,-4.5) C7(-15,-4.5) C8(-17.5,-4.5) C9(-20,-4.5) C10(-22.5,-4.5) D1(0,-6) D2(-2.5,-6) D3(-5,-6) D4(-7.5,-6) D5(-10,-6) D6(-12.5,-6) D7(-15,-6) D8(-17.5,-6) D9(-20,-6) D10(-22.5,-6) DG1(0,-7.5) DG2(-2.5,-7.5) DG3(-5,-7.5) DG4(-7.5,-7.5) DG5(-10,-7.5) DG6(-12.5,-7.5) DG7(-15,-7.5) DG8(-17.5,-7.5) DG9(-20,-7.5) DG10(-22.5,-7.5) E1(0,-9) E2(-2.5,-9) E3(-5,-9) E4(-7.5,-9) E5(-10,-9) E6(-12.5,-9) E7(-15,-9) E8(-17.5,-9) E9(-20,-9) E10(-22.5,-9) F1(0,-10.5) F2(-2.5,-10.5) F3(-5,-10.5) F4(-7.5,-10.5) F5(-10,-10.5) F6(-12.5,-10.5) F7(-15,-10.5) F8(-17.5,-10.5) F9(-20,-10.5) F10(-22.5,-10.5) FG1(0,-12) FG2(-2.5,-12) FG3(-5,-12) FG4(-7.5,-12) FG5(-10,-12) FG6(-12.5,-12) FG7(-15,-12) FG8(-17.5,-12) FG9(-20,-12) FG10(-22.5,-12)
Mechanical 13:
  lines w0.1: -24.15,2 0.75,2 ; 0.725,17.35 -24.15,17.35 -24.15,-12.7 0.75,-12.7 0.75,17.35
Mechanical 15:
  lines w0.1: -22.5,1.5 0,1.5
Mechanical 16:
  circle w1: c-22.5,-12 r0.001
  circle w1: c0,-12 r0.001
  circle w1: c-2.5,-12 r0.001
  circle w1: c-5,-12 r0.001
  circle w1: c-7.5,-12 r0.001
  circle w1: c-10,-12 r0.001
  circle w1: c-12.5,-12 r0.001
  circle w1: c-15,-12 r0.001
  circle w1: c-17.5,-12 r0.001
  circle w1: c-20,-12 r0.001
  circle w1: c-22.5,-10.5 r0.001
  circle w1: c0,-10.5 r0.001
  circle w1: c-2.5,-10.5 r0.001
  circle w1: c-5,-10.5 r0.001
  circle w1: c-7.5,-10.5 r0.001
  circle w1: c-10,-10.5 r0.001
  circle w1: c-12.5,-10.5 r0.001
  circle w1: c-15,-10.5 r0.001
  circle w1: c-17.5,-10.5 r0.001
  circle w1: c-20,-10.5 r0.001
  circle w1: c-22.5,-9 r0.001
  circle w1: c0,-9 r0.001
  circle w1: c-2.5,-9 r0.001
  circle w1: c-5,-9 r0.001
  circle w1: c-7.5,-9 r0.001
  circle w1: c-10,-9 r0.001
  circle w1: c-12.5,-9 r0.001
  circle w1: c-15,-9 r0.001
  circle w1: c-17.5,-9 r0.001
  circle w1: c-20,-9 r0.001
  circle w1: c-22.5,-7.5 r0.001
  circle w1: c0,-7.5 r0.001
  circle w1: c-2.5,-7.5 r0.001
  circle w1: c-5,-7.5 r0.001
  circle w1: c-7.5,-7.5 r0.001
  circle w1: c-10,-7.5 r0.001
  circle w1: c-12.5,-7.5 r0.001
  circle w1: c-15,-7.5 r0.001
  circle w1: c-17.5,-7.5 r0.001
  circle w1: c-20,-7.5 r0.001
  circle w1: c-22.5,-6 r0.001
  circle w1: c0,-6 r0.001
  circle w1: c-2.5,-6 r0.001
  circle w1: c-5,-6 r0.001
  circle w1: c-7.5,-6 r0.001
  circle w1: c-10,-6 r0.001
  circle w1: c-12.5,-6 r0.001
  circle w1: c-15,-6 r0.001
  circle w1: c-17.5,-6 r0.001
  circle w1: c-20,-6 r0.001
  circle w1: c-22.5,-4.5 r0.001
  circle w1: c0,-4.5 r0.001
  circle w1: c-2.5,-4.5 r0.001
  circle w1: c-5,-4.5 r0.001
  circle w1: c-7.5,-4.5 r0.001
  circle w1: c-10,-4.5 r0.001
  circle w1: c-12.5,-4.5 r0.001
  circle w1: c-15,-4.5 r0.001
  circle w1: c-17.5,-4.5 r0.001
  circle w1: c-20,-4.5 r0.001
  circle w1: c-22.5,-3 r0.001
  circle w1: c0,-3 r0.001
  circle w1: c-2.5,-3 r0.001
  circle w1: c-5,-3 r0.001
  circle w1: c-7.5,-3 r0.001
  circle w1: c-10,-3 r0.001
  circle w1: c-12.5,-3 r0.001
  circle w1: c-15,-3 r0.001
  circle w1: c-17.5,-3 r0.001
  circle w1: c-20,-3 r0.001
  circle w1: c-20,-1.5 r0.001
  circle w1: c-17.5,-1.5 r0.001
  circle w1: c-15,-1.5 r0.001
  circle w1: c-12.5,-1.5 r0.001
  circle w1: c-10,-1.5 r0.001
  circle w1: c-7.5,-1.5 r0.001
  circle w1: c-5,-1.5 r0.001
  circle w1: c-2.5,-1.5 r0.001
  circle w1: c0,-1.5 r0.001
  circle w1: c0,0 r0.001
  circle w1: c-2.5,0 r0.001
  circle w1: c-5,0 r0.001
  circle w1: c-7.5,0 r0.001
  circle w1: c-10,0 r0.001
  circle w1: c-12.5,0 r0.001
  circle w1: c-15,0 r0.001
  circle w1: c-17.5,0 r0.001
  circle w1: c-22.5,0 r0.001
  circle w1: c-20,0 r0.001
  circle w1: c-22.5,-1.5 r0.001
  text "Drilled hole: 0.7 ± 0.02 mm" at -24.003,4.318 h2.5
  text "Finished hole: 0.6 ± 0.05 mm" at -24.003,2.286 h2.5
3D body: height 13.34, standoff -5.66, extent -24.15,-12.65 0.75,17.35